# Altium schematic symbol library Analog Devices Operational Amplifiers.SchLib: 2102 symbols (part 28 of 35) (continued)
## ADA4895-2ARMZ
designator U?
Double Channel Low Wide Band Noise Operational Amplifier, 236 MHz BW, 943 V/us SR, Industrial, 10-pin SOP (RM-10), Tray; Generic Part Number: ADA4895-2; Manufacturer: Analog Devices; PartNumber: ADA4895-2ARMZ; Amplifiers Per Package: 2; Input Bias Current: 11uA; Input Offset Voltage: 28uV; Iq/Amp: 3mA; Small Signal Bandwidth: 236MHz; V Span Max: 10V; V Span Min: 3V; DatasheetVersion: Rev. 0; PackageReference: RM-10; PackageDescription: 10-Pin Mini Small Outline Package, Body 3 x 3 mm, Pitch 0.5 mm; Supplier 1: Digi-Key; Supplier Part Number 1: ADA4895-2ARMZ-ND; Supplier 2: Newark; Supplier Part Number 2: 45W7013; Packing: Tray; Slew Rate: 943V/us; Mounting Technology: Surface Mount; Code_JEDEC: MO-187-BA; ComponentLink1Description: Manufacturer URL; ComponentLink1URL: http://www.analog.com/en/index.html; ComponentLink2Description: Datasheet; ComponentLink2URL: http://www.analog.com/static/imported-files/data_sheets/ADA4895-2.PDF; ComponentLink3Description: Package Specification; ComponentLink3URL: http://www.analog.com/static/imported-files/packages/PKG_PDF/MSOP%28RM%29/RM_10.pdf
footprint ADI-RM-10_N (SOP, 10-Leads, Body 3x3mm, Pitch 0.5mm, IPC Medium Density)
footprint ADI-RM-10_L (SOP, 10-Leads, Body 3x3mm, Pitch 0.5mm, IPC High Density)
footprint ADI-RM-10_M (SOP, 10-Leads, Body 3x3mm, Pitch 0.5mm, IPC Low Density)
pins on every part: 4 -VS (power) "Negative Supply.", 10 +VS (power) "Positive Supply."
part A pins: 1 OUT 1 (out) "Output 1.", 2 -IN 1 (in) "Inverting Input 1.", 3 +IN 1 (in) "Noninverting Input 1.", 5 ~{DISABLE1} (in) "Disable 1."
part B pins: 6 ~{DISABLE2} (in) "Disable 2.", 7 +IN 2 (in) "Noninverting Input 2.", 8 -IN 2 (in) "Inverting Input 2.", 9 OUT 2 (out) "Output 2."

## ADA4895-2ARMZ-R7
designator U?
Double Channel Low Wide Band Noise Operational Amplifier, 236 MHz BW, 943 V/us SR, Industrial, 10-pin SOP (RM-10), Reel; Generic Part Number: ADA4895-2; Manufacturer: Analog Devices; PartNumber: ADA4895-2ARMZ-R7; Amplifiers Per Package: 2; Input Bias Current: 11uA; Input Offset Voltage: 28uV; Iq/Amp: 3mA; Small Signal Bandwidth: 236MHz; V Span Max: 10V; V Span Min: 3V; DatasheetVersion: Rev. 0; PackageReference: RM-10; PackageDescription: 10-Pin Mini Small Outline Package, Body 3 x 3 mm, Pitch 0.5 mm; Supplier 1: Digi-Key; Supplier Part Number 1: ADA4895-2ARMZ-R7TR-ND; Supplier 2: Digi-Key; Supplier Part Number 2: ADA4895-2ARMZ-R7CT-ND; Supplier 3: Digi-Key; Supplier Part Number 3: ADA4895-2ARMZ-R7DKR-ND; Supplier 4: Farnell; Supplier Part Number 4: 2250673; Supplier 5: Newark; Supplier Part Number 5: 45W7015; Supplier 6: Newark; Supplier Part Number 6: 47W3297; Packing: Reel; Slew Rate: 943V/us; Mounting Technology: Surface Mount; Code_JEDEC: MO-187-BA; ComponentLink1Description: Manufacturer URL; ComponentLink1URL: http://www.analog.com/en/index.html; ComponentLink2Description: Datasheet; ComponentLink2URL: http://www.analog.com/static/imported-files/data_sheets/ADA4895-2.PDF; ComponentLink3Description: Package Specification; ComponentLink3URL: http://www.analog.com/static/imported-files/packages/PKG_PDF/MSOP%28RM%29/RM_10.pdf
footprint ADI-RM-10_N (SOP, 10-Leads, Body 3x3mm, Pitch 0.5mm, IPC Medium Density)
footprint ADI-RM-10_L (SOP, 10-Leads, Body 3x3mm, Pitch 0.5mm, IPC High Density)
footprint ADI-RM-10_M (SOP, 10-Leads, Body 3x3mm, Pitch 0.5mm, IPC Low Density)
pins on every part: 4 -VS (power) "Negative Supply.", 10 +VS (power) "Positive Supply."
part A pins: 1 OUT 1 (out) "Output 1.", 2 -IN 1 (in) "Inverting Input 1.", 3 +IN 1 (in) "Noninverting Input 1.", 5 ~{DISABLE1} (in) "Disable 1."
part B pins: 6 ~{DISABLE2} (in) "Disable 2.", 7 +IN 2 (in) "Noninverting Input 2.", 8 -IN 2 (in) "Inverting Input 2.", 9 OUT 2 (out) "Output 2."

## ADA4895-2ARMZ-RL
designator U?
Double Channel Low Wide Band Noise Operational Amplifier, 236 MHz BW, 943 V/us SR, Industrial, 10-pin SOP (RM-10), Reel; Generic Part Number: ADA4895-2; Manufacturer: Analog Devices; PartNumber: ADA4895-2ARMZ-RL; Amplifiers Per Package: 2; Input Bias Current: 11uA; Input Offset Voltage: 28uV; Iq/Amp: 3mA; Small Signal Bandwidth: 236MHz; V Span Max: 10V; V Span Min: 3V; DatasheetVersion: Rev. 0; PackageReference: RM-10; PackageDescription: 10-Pin Mini Small Outline Package, Body 3 x 3 mm, Pitch 0.5 mm; Supplier 1: Digi-Key; Supplier Part Number 1: ADA4895-2ARMZ-RL-ND; Supplier 2: Newark; Supplier Part Number 2: 45W7014; Packing: Reel; Slew Rate: 943V/us; Mounting Technology: Surface Mount; Code_JEDEC: MO-187-BA; ComponentLink1Description: Manufacturer URL; ComponentLink1URL: http://www.analog.com/en/index.html; ComponentLink2Description: Datasheet; ComponentLink2URL: http://www.analog.com/static/imported-files/data_sheets/ADA4895-2.PDF; ComponentLink3Description: Package Specification; ComponentLink3URL: http://www.analog.com/static/imported-files/packages/PKG_PDF/MSOP%28RM%29/RM_10.pdf
footprint ADI-RM-10_N (SOP, 10-Leads, Body 3x3mm, Pitch 0.5mm, IPC Medium Density)
footprint ADI-RM-10_L (SOP, 10-Leads, Body 3x3mm, Pitch 0.5mm, IPC High Density)
footprint ADI-RM-10_M (SOP, 10-Leads, Body 3x3mm, Pitch 0.5mm, IPC Low Density)
pins on every part: 4 -VS (power) "Negative Supply.", 10 +VS (power) "Positive Supply."
part A pins: 1 OUT 1 (out) "Output 1.", 2 -IN 1 (in) "Inverting Input 1.", 3 +IN 1 (in) "Noninverting Input 1.", 5 ~{DISABLE1} (in) "Disable 1."
part B pins: 6 ~{DISABLE2} (in) "Disable 2.", 7 +IN 2 (in) "Noninverting Input 2.", 8 -IN 2 (in) "Inverting Input 2.", 9 OUT 2 (out) "Output 2."

## ADA4896-2ACPZ-R2
designator U?
Double Channel Low Wide Band Noise Operational Amplifier, 230 MHz BW, 120 V/us SR, Industrial, 8-pin SON (CP-8-11), Reel; Generic Part Number: ADA4896-2; Manufacturer: Analog Devices; PartNumber: ADA4896-2ACPZ-R2; Amplifiers Per Package: 2; Input Bias Current: 11uA; Input Offset Voltage: 28uV; Iq/Amp: 3mA; Small Signal Bandwidth: 230MHz; V Span Max: 10V; V Span Min: 3V; DatasheetVersion: Rev. B; PackageVersion: 01-24-2011-B; PackageReference: CP-8-11; PackageDescription: 8-Pin Lead Frame Chip Scale Package, Body 3 x 3 mm, Pitch 0.5 mm; Packing: Reel; Slew Rate: 120V/us; Mounting Technology: Surface Mount; Code_JEDEC: MO-229-WEED; ComponentLink1Description: Manufacturer URL; ComponentLink1URL: http://www.analog.com/en/index.html; ComponentLink2Description: Datasheet; ComponentLink2URL: http://www.analog.com/static/imported-files/data_sheets/ADA4896-2_4897-1_4897-2.PDF; ComponentLink3Description: Package Specification; ComponentLink3URL: http://www.analog.com/static/imported-files/packages/PKG_PDF/LFCSP(CP)/CP_8_11.pdf
footprint ADI-CP-8-11_N (SON, 8-Leads, Body 3x3mm, Pitch 0.5mm, Thermal Pad 2.34 x 1.60mm, IPC Medium Density)
footprint ADI-CP-8-11_L (SON, 8-Leads, Body 3x3mm, Pitch 0.5mm, Thermal Pad 2.34 x 1.60mm, IPC High Density)
footprint ADI-CP-8-11_M (SON, 8-Leads, Body 3x3mm, Pitch 0.5mm, Thermal Pad 2.34 x 1.60mm, IPC Low Density)
pins on every part: 4 -VS (power), 8 +VS (power), 9 EP
part A pins: 1 OUT 1 (out), 2 -IN 1 (in), 3 +IN 1 (in)
part B pins: 5 +IN 2 (in), 6 -IN 2 (in), 7 OUT 2 (out)

## ADA4896-2ACPZ-R7
designator U?
Double Channel Low Wide Band Noise Operational Amplifier, 230 MHz BW, 120 V/us SR, Industrial, 8-pin SON (CP-8-11), Reel; Generic Part Number: ADA4896-2; Manufacturer: Analog Devices; PartNumber: ADA4896-2ACPZ-R7; Amplifiers Per Package: 2; Input Bias Current: 11uA; Input Offset Voltage: 28uV; Iq/Amp: 3mA; Small Signal Bandwidth: 230MHz; V Span Max: 10V; V Span Min: 3V; DatasheetVersion: Rev. B; PackageVersion: 01-24-2011-B; PackageReference: CP-8-11; PackageDescription: 8-Pin Lead Frame Chip Scale Package, Body 3 x 3 mm, Pitch 0.5 mm; Supplier 1: Digi-Key; Supplier Part Number 1: ADA4896-2ACPZ-R7-ND; Supplier 2: Newark; Supplier Part Number 2: 58T8813; Packing: Reel; Slew Rate: 120V/us; Mounting Technology: Surface Mount; Code_JEDEC: MO-229-WEED; ComponentLink1Description: Manufacturer URL; ComponentLink1URL: http://www.analog.com/en/index.html; ComponentLink2Description: Datasheet; ComponentLink2URL: http://www.analog.com/static/imported-files/data_sheets/ADA4896-2_4897-1_4897-2.PDF; ComponentLink3Description: Package Specification; ComponentLink3URL: http://www.analog.com/static/imported-files/packages/PKG_PDF/LFCSP(CP)/CP_8_11.pdf
footprint ADI-CP-8-11_N (SON, 8-Leads, Body 3x3mm, Pitch 0.5mm, Thermal Pad 2.34 x 1.60mm, IPC Medium Density)
footprint ADI-CP-8-11_L (SON, 8-Leads, Body 3x3mm, Pitch 0.5mm, Thermal Pad 2.34 x 1.60mm, IPC High Density)
footprint ADI-CP-8-11_M (SON, 8-Leads, Body 3x3mm, Pitch 0.5mm, Thermal Pad 2.34 x 1.60mm, IPC Low Density)
pins on every part: 4 -VS (power), 8 +VS (power), 9 EP
part A pins: 1 OUT 1 (out), 2 -IN 1 (in), 3 +IN 1 (in)
part B pins: 5 +IN 2 (in), 6 -IN 2 (in), 7 OUT 2 (out)

## ADA4896-2ACPZ-RL
designator U?
Double Channel Low Wide Band Noise Operational Amplifier, 230 MHz BW, 120 V/us SR, Industrial, 8-pin SON (CP-8-11), Reel; Generic Part Number: ADA4896-2; Manufacturer: Analog Devices; PartNumber: ADA4896-2ACPZ-RL; Amplifiers Per Package: 2; Input Bias Current: 11uA; Input Offset Voltage: 28uV; Iq/Amp: 3mA; Small Signal Bandwidth: 230MHz; V Span Max: 10V; V Span Min: 3V; DatasheetVersion: Rev. B; PackageVersion: 01-24-2011-B; PackageReference: CP-8-11; PackageDescription: 8-Pin Lead Frame Chip Scale Package, Body 3 x 3 mm, Pitch 0.5 mm; Supplier 1: Digi-Key; Supplier Part Number 1: ADA4896-2ACPZ-RL-ND; Packing: Reel; Slew Rate: 120V/us; Mounting Technology: Surface Mount; Code_JEDEC: MO-229-WEED; ComponentLink1Description: Manufacturer URL; ComponentLink1URL: http://www.analog.com/en/index.html; ComponentLink2Description: Datasheet; ComponentLink2URL: http://www.analog.com/static/imported-files/data_sheets/ADA4896-2_4897-1_4897-2.PDF; ComponentLink3Description: Package Specification; ComponentLink3URL: http://www.analog.com/static/imported-files/packages/PKG_PDF/LFCSP(CP)/CP_8_11.pdf
footprint ADI-CP-8-11_N (SON, 8-Leads, Body 3x3mm, Pitch 0.5mm, Thermal Pad 2.34 x 1.60mm, IPC Medium Density)
footprint ADI-CP-8-11_L (SON, 8-Leads, Body 3x3mm, Pitch 0.5mm, Thermal Pad 2.34 x 1.60mm, IPC High Density)
footprint ADI-CP-8-11_M (SON, 8-Leads, Body 3x3mm, Pitch 0.5mm, Thermal Pad 2.34 x 1.60mm, IPC Low Density)
pins on every part: 4 -VS (power), 8 +VS (power), 9 EP
part A pins: 1 OUT 1 (out), 2 -IN 1 (in), 3 +IN 1 (in)
part B pins: 5 +IN 2 (in), 6 -IN 2 (in), 7 OUT 2 (out)

## ADA4896-2ARMZ
designator U?
Double Channel Low Wide Band Noise Operational Amplifier, 230 MHz BW, 120 V/us SR, Industrial, 8-pin SOP (RM-8), Tube; Generic Part Number: ADA4896-2; Manufacturer: Analog Devices; PartNumber: ADA4896-2ARMZ; Amplifiers Per Package: 2; Input Bias Current: 11uA; Input Offset Voltage: 28uV; Iq/Amp: 3mA; Small Signal Bandwidth: 230MHz; V Span Max: 10V; V Span Min: 3V; DatasheetVersion: Rev. B; PackageReference: RM-8; PackageDescription: 8-Pin Mini Small Outline Package, Body 3 x 3 mm, Pitch 0.65 mm; Supplier 1: Digi-Key; Supplier Part Number 1: ADA4896-2ARMZ-ND; Supplier 2: Farnell; Supplier Part Number 2: 2008778; Supplier 3: Newark; Supplier Part Number 3: 58T8814; Packing: Tube; Slew Rate: 120V/us; Mounting Technology: Surface Mount; Code_JEDEC: MO-187-AA; ComponentLink1Description: Manufacturer URL; ComponentLink1URL: http://www.analog.com/en/index.html; ComponentLink2Description: Datasheet; ComponentLink2URL: http://www.analog.com/static/imported-files/data_sheets/ADA4896-2_4897-1_4897-2.PDF; ComponentLink3Description: Package Specification; ComponentLink3URL: http://www.analog.com/static/imported-files/packages/PKG_PDF/MSOP%28RM%29/RM_8.pdf
footprint ADI-RM-8_N (SOP, 8-Leads, Body 3x3mm, Pitch 0.65mm, IPC Medium Density)
footprint ADI-RM-8_L (SOP, 8-Leads, Body 3x3mm, Pitch 0.65mm, IPC High Density)
footprint ADI-RM-8_M (SOP, 8-Leads, Body 3x3mm, Pitch 0.65mm, IPC Low Density)
pins on every part: 4 -VS (power), 8 +VS (power)
part A pins: 1 OUT 1 (out), 2 -IN 1 (in), 3 +IN 1 (in)
part B pins: 5 +IN 2 (in), 6 -IN 2 (in), 7 OUT 2 (out)

## ADA4896-2ARMZ-R7
designator U?
Double Channel Low Wide Band Noise Operational Amplifier, 230 MHz BW, 120 V/us SR, Industrial, 8-pin SOP (RM-8), Reel; Generic Part Number: ADA4896-2; Manufacturer: Analog Devices; PartNumber: ADA4896-2ARMZ-R7; Amplifiers Per Package: 2; Input Bias Current: 11uA; Input Offset Voltage: 28uV; Iq/Amp: 3mA; Small Signal Bandwidth: 230MHz; V Span Max: 10V; V Span Min: 3V; DatasheetVersion: Rev. B; PackageReference: RM-8; PackageDescription: 8-Pin Mini Small Outline Package, Body 3 x 3 mm, Pitch 0.65 mm; Supplier 1: Digi-Key; Supplier Part Number 1: ADA4896-2ARMZ-R7TR-ND; Supplier 2: Digi-Key; Supplier Part Number 2: ADA4896-2ARMZ-R7CT-ND; Supplier 3: Digi-Key; Supplier Part Number 3: ADA4896-2ARMZ-R7DKR-ND; Supplier 4: Newark; Supplier Part Number 4: 58T8815; Packing: Reel; Slew Rate: 120V/us; Mounting Technology: Surface Mount; Code_JEDEC: MO-187-AA; ComponentLink1Description: Manufacturer URL; ComponentLink1URL: http://www.analog.com/en/index.html; ComponentLink2Description: Datasheet; ComponentLink2URL: http://www.analog.com/static/imported-files/data_sheets/ADA4896-2_4897-1_4897-2.PDF; ComponentLink3Description: Package Specification; ComponentLink3URL: http://www.analog.com/static/imported-files/packages/PKG_PDF/MSOP%28RM%29/RM_8.pdf
footprint ADI-RM-8_N (SOP, 8-Leads, Body 3x3mm, Pitch 0.65mm, IPC Medium Density)
footprint ADI-RM-8_L (SOP, 8-Leads, Body 3x3mm, Pitch 0.65mm, IPC High Density)
footprint ADI-RM-8_M (SOP, 8-Leads, Body 3x3mm, Pitch 0.65mm, IPC Low Density)
pins on every part: 4 -VS (power), 8 +VS (power)
part A pins: 1 OUT 1 (out), 2 -IN 1 (in), 3 +IN 1 (in)
part B pins: 5 +IN 2 (in), 6 -IN 2 (in), 7 OUT 2 (out)

## ADA4896-2ARMZ-RL
designator U?
Double Channel Low Wide Band Noise Operational Amplifier, 230 MHz BW, 120 V/us SR, Industrial, 8-pin SOP (RM-8), Reel; Generic Part Number: ADA4896-2; Manufacturer: Analog Devices; PartNumber: ADA4896-2ARMZ-RL; Amplifiers Per Package: 2; Input Bias Current: 11uA; Input Offset Voltage: 28uV; Iq/Amp: 3mA; Small Signal Bandwidth: 230MHz; V Span Max: 10V; V Span Min: 3V; DatasheetVersion: Rev. B; PackageReference: RM-8; PackageDescription: 8-Pin Mini Small Outline Package, Body 3 x 3 mm, Pitch 0.65 mm; Packing: Reel; Slew Rate: 120V/us; Mounting Technology: Surface Mount; Code_JEDEC: MO-187-AA; ComponentLink1Description: Manufacturer URL; ComponentLink1URL: http://www.analog.com/en/index.html; ComponentLink2Description: Datasheet; ComponentLink2URL: http://www.analog.com/static/imported-files/data_sheets/ADA4896-2_4897-1_4897-2.PDF; ComponentLink3Description: Package Specification; ComponentLink3URL: http://www.analog.com/static/imported-files/packages/PKG_PDF/MSOP%28RM%29/RM_8.pdf
footprint ADI-RM-8_N (SOP, 8-Leads, Body 3x3mm, Pitch 0.65mm, IPC Medium Density)
footprint ADI-RM-8_L (SOP, 8-Leads, Body 3x3mm, Pitch 0.65mm, IPC High Density)
footprint ADI-RM-8_M (SOP, 8-Leads, Body 3x3mm, Pitch 0.65mm, IPC Low Density)
pins on every part: 4 -VS (power), 8 +VS (power)
part A pins: 1 OUT 1 (out), 2 -IN 1 (in), 3 +IN 1 (in)
part B pins: 5 +IN 2 (in), 6 -IN 2 (in), 7 OUT 2 (out)

## ADA4897-1ARJZ-R2
designator U?
Single Channel Low Wide Band Noise Operational Amplifier, 230 MHz BW, 120 V/us SR, Industrial, 6-pin SOT23 (RJ-6), Reel; Generic Part Number: ADA4897-1; Manufacturer: Analog Devices; PartNumber: ADA4897-1ARJZ-R2; Amplifiers Per Package: 1; Input Bias Current: 11uA; Input Offset Voltage: 28uV; Iq/Amp: 3mA; Small Signal Bandwidth: 230MHz; V Span Max: 10V; V Span Min: 3V; DatasheetVersion: Rev. B; PackageVersion: 121608-A; PackageReference: RJ-6; PackageDescription: 6-Pin Small Outline Transistor Package, Body 2.9 x 1.6 mm, Pitch 0.95 mm; Packing: Reel; Slew Rate: 120V/us; Mounting Technology: Surface Mount; Code_JEDEC: MO-178-AB; ComponentLink1Description: Manufacturer URL; ComponentLink1URL: http://www.analog.com/en/index.html; ComponentLink2Description: Datasheet; ComponentLink2URL: http://www.analog.com/static/imported-files/data_sheets/ADA4896-2_4897-1_4897-2.PDF; ComponentLink3Description: Package Specification; ComponentLink3URL: http://www.analog.com/static/imported-files/packages/PKG_PDF/SOT-23(RJ)/RJ_6.pdf; ComponentLink4Description: Reference Circuit; ComponentLink4URL: http://search.analog.com/search/ProductSearch.aspx?query=ada4897-1&amp;locale=en#product-recommendations
footprint ADI-RJ-6_N (SOT23, 6-Leads, Body 2.9x1.6mm, Pitch 0.95mm, IPC Medium Density)
footprint ADI-RJ-6_L (SOT23, 6-Leads, Body 2.9x1.6mm, Pitch 0.95mm, IPC High Density)
footprint ADI-RJ-6_M (SOT23, 6-Leads, Body 2.9x1.6mm, Pitch 0.95mm, IPC Low Density)
pins: 1 OUT (hiz) "Output.", 2 -VS (power) "Negative Supply.", 3 +IN (in) "Noninverting Input.", 4 -IN (in) "Inverting Input.", 5 ~{DISABLE} (in) "Disable.", 6 +VS (power) "Positive Supply."

## ADA4897-1ARJZ-R7
designator U?
Single Channel Low Wide Band Noise Operational Amplifier, 230 MHz BW, 120 V/us SR, Industrial, 6-pin SOT23 (RJ-6), Reel; Generic Part Number: ADA4897-1; Manufacturer: Analog Devices; PartNumber: ADA4897-1ARJZ-R7; Amplifiers Per Package: 1; Input Bias Current: 11uA; Input Offset Voltage: 28uV; Iq/Amp: 3mA; Small Signal Bandwidth: 230MHz; V Span Max: 10V; V Span Min: 3V; DatasheetVersion: Rev. B; PackageVersion: 121608-A; PackageReference: RJ-6; PackageDescription: 6-Pin Small Outline Transistor Package, Body 2.9 x 1.6 mm, Pitch 0.95 mm; Supplier 1: Digi-Key; Supplier Part Number 1: ADA4897-1ARJZ-R7TR-ND; Supplier 2: Digi-Key; Supplier Part Number 2: ADA4897-1ARJZ-R7CT-ND; Supplier 3: Digi-Key; Supplier Part Number 3: ADA4897-1ARJZ-R7DKR-ND; Supplier 4: Newark; Supplier Part Number 4: 58T8817; Packing: Reel; Slew Rate: 120V/us; Mounting Technology: Surface Mount; Code_JEDEC: MO-178-AB; ComponentLink1Description: Manufacturer URL; ComponentLink1URL: http://www.analog.com/en/index.html; ComponentLink2Description: Datasheet; ComponentLink2URL: http://www.analog.com/static/imported-files/data_sheets/ADA4896-2_4897-1_4897-2.PDF; ComponentLink3Description: Package Specification; ComponentLink3URL: http://www.analog.com/static/imported-files/packages/PKG_PDF/SOT-23(RJ)/RJ_6.pdf; ComponentLink4Description: Reference Circuit; ComponentLink4URL: http://search.analog.com/search/ProductSearch.aspx?query=ada4897-1&amp;locale=en#product-recommendations
footprint ADI-RJ-6_N (SOT23, 6-Leads, Body 2.9x1.6mm, Pitch 0.95mm, IPC Medium Density)
footprint ADI-RJ-6_L (SOT23, 6-Leads, Body 2.9x1.6mm, Pitch 0.95mm, IPC High Density)
footprint ADI-RJ-6_M (SOT23, 6-Leads, Body 2.9x1.6mm, Pitch 0.95mm, IPC Low Density)
pins: 1 OUT (hiz) "Output.", 2 -VS (power) "Negative Supply.", 3 +IN (in) "Noninverting Input.", 4 -IN (in) "Inverting Input.", 5 ~{DISABLE} (in) "Disable.", 6 +VS (power) "Positive Supply."

## ADA4897-1ARJZ-RL
designator U?
Single Channel Low Wide Band Noise Operational Amplifier, 230 MHz BW, 120 V/us SR, Industrial, 6-pin SOT23 (RJ-6), Reel; Generic Part Number: ADA4897-1; Manufacturer: Analog Devices; PartNumber: ADA4897-1ARJZ-RL; Amplifiers Per Package: 1; Input Bias Current: 11uA; Input Offset Voltage: 28uV; Iq/Amp: 3mA; Small Signal Bandwidth: 230MHz; V Span Max: 10V; V Span Min: 3V; DatasheetVersion: Rev. B; PackageVersion: 121608-A; PackageReference: RJ-6; PackageDescription: 6-Pin Small Outline Transistor Package, Body 2.9 x 1.6 mm, Pitch 0.95 mm; Supplier 1: Digi-Key; Supplier Part Number 1: ADA4897-1ARJZ-RL-ND; Supplier 2: Newark; Supplier Part Number 2: 58T8816; Packing: Reel; Slew Rate: 120V/us; Mounting Technology: Surface Mount; Code_JEDEC: MO-178-AB; ComponentLink1Description: Manufacturer URL; ComponentLink1URL: http://www.analog.com/en/index.html; ComponentLink2Description: Datasheet; ComponentLink2URL: http://www.analog.com/static/imported-files/data_sheets/ADA4896-2_4897-1_4897-2.PDF; ComponentLink3Description: Package Specification; ComponentLink3URL: http://www.analog.com/static/imported-files/packages/PKG_PDF/SOT-23(RJ)/RJ_6.pdf; ComponentLink4Description: Reference Circuit; ComponentLink4URL: http://search.analog.com/search/ProductSearch.aspx?query=ada4897-1&amp;locale=en#product-recommendations
footprint ADI-RJ-6_N (SOT23, 6-Leads, Body 2.9x1.6mm, Pitch 0.95mm, IPC Medium Density)
footprint ADI-RJ-6_L (SOT23, 6-Leads, Body 2.9x1.6mm, Pitch 0.95mm, IPC High Density)
footprint ADI-RJ-6_M (SOT23, 6-Leads, Body 2.9x1.6mm, Pitch 0.95mm, IPC Low Density)
pins: 1 OUT (hiz) "Output.", 2 -VS (power) "Negative Supply.", 3 +IN (in) "Noninverting Input.", 4 -IN (in) "Inverting Input.", 5 ~{DISABLE} (in) "Disable.", 6 +VS (power) "Positive Supply."

## ADA4897-1ARZ
designator U?
Single Channel Low Wide Band Noise Operational Amplifier, 230 MHz BW, 120 V/us SR, Industrial, 8-pin SOIC (R-8), Tube; Generic Part Number: ADA4897-1; Manufacturer: Analog Devices; PartNumber: ADA4897-1ARZ; Amplifiers Per Package: 1; Input Bias Current: 11uA; Input Offset Voltage: 28uV; Iq/Amp: 3mA; Small Signal Bandwidth: 230MHz; V Span Max: 10V; V Span Min: 3V; DatasheetVersion: Rev. B; PackageVersion: 060506-A; PackageReference: R-8; PackageDescription: 8-Pin Standard Small Outline Package, Body 3.9 x 4.9 mm, Pitch 1.27 mm; Supplier 1: Digi-Key; Supplier Part Number 1: ADA4897-1ARZ-ND; Supplier 2: Farnell; Supplier Part Number 2: 2008779; Supplier 3: Newark; Supplier Part Number 3: 58T8818; Packing: Tube; Slew Rate: 120V/us; Mounting Technology: Surface Mount; Code_JEDEC: MS-012-AA; ComponentLink1Description: Manufacturer URL; ComponentLink1URL: http://www.analog.com/en/index.html; ComponentLink2Description: Datasheet; ComponentLink2URL: http://www.analog.com/static/imported-files/data_sheets/ADA4896-2_4897-1_4897-2.PDF; ComponentLink3Description: Package Specification; ComponentLink3URL: http://www.analog.com/static/imported-files/packages/PKG_PDF/SOIC_Narrow%20(R)/R_8.pdf; ComponentLink4Description: Reference Circuit; ComponentLink4URL: http://search.analog.com/search/ProductSearch.aspx?query=ada4897-1&amp;locale=en#product-recommendations
footprint ADI-R-8_N (SOIC, 8-Leads, Body 4.9x3.9mm, Pitch 1.27mm, IPC Medium Density)
footprint ADI-R-8_L (SOIC, 8-Leads, Body 4.9x3.9mm, Pitch 1.27mm, IPC High Density)
footprint ADI-R-8_M (SOIC, 8-Leads, Body 4.9x3.9mm, Pitch 1.27mm, IPC Low Density)
pins: 1 NC, 2 -IN (in), 3 +IN (in), 4 -VS (power), 5 NC, 6 OUT (hiz), 7 +VS (power), 8 ~{DISABLE} (in)

## ADA4897-1ARZ-R7
designator U?
Single Channel Low Wide Band Noise Operational Amplifier, 230 MHz BW, 120 V/us SR, Industrial, 8-pin SOIC (R-8), Reel; Generic Part Number: ADA4897-1; Manufacturer: Analog Devices; PartNumber: ADA4897-1ARZ-R7; Amplifiers Per Package: 1; Input Bias Current: 11uA; Input Offset Voltage: 28uV; Iq/Amp: 3mA; Small Signal Bandwidth: 230MHz; V Span Max: 10V; V Span Min: 3V; DatasheetVersion: Rev. B; PackageVersion: 060506-A; PackageReference: R-8; PackageDescription: 8-Pin Standard Small Outline Package, Body 3.9 x 4.9 mm, Pitch 1.27 mm; Supplier 1: Digi-Key; Supplier Part Number 1: ADA4897-1ARZ-R7TR-ND; Supplier 2: Digi-Key; Supplier Part Number 2: ADA4897-1ARZ-R7CT-ND; Supplier 3: Digi-Key; Supplier Part Number 3: ADA4897-1ARZ-R7DKR-ND; Packing: Reel; Slew Rate: 120V/us; Mounting Technology: Surface Mount; Code_JEDEC: MS-012-AA; ComponentLink1Description: Manufacturer URL; ComponentLink1URL: http://www.analog.com/en/index.html; ComponentLink2Description: Datasheet; ComponentLink2URL: http://www.analog.com/static/imported-files/data_sheets/ADA4896-2_4897-1_4897-2.PDF; ComponentLink3Description: Package Specification; ComponentLink3URL: http://www.analog.com/static/imported-files/packages/PKG_PDF/SOIC_Narrow%20(R)/R_8.pdf; ComponentLink4Description: Reference Circuit; ComponentLink4URL: http://search.analog.com/search/ProductSearch.aspx?query=ada4897-1&amp;locale=en#product-recommendations
footprint ADI-R-8_N (SOIC, 8-Leads, Body 4.9x3.9mm, Pitch 1.27mm, IPC Medium Density)
footprint ADI-R-8_L (SOIC, 8-Leads, Body 4.9x3.9mm, Pitch 1.27mm, IPC High Density)
footprint ADI-R-8_M (SOIC, 8-Leads, Body 4.9x3.9mm, Pitch 1.27mm, IPC Low Density)
pins: 1 NC, 2 -IN (in), 3 +IN (in), 4 -VS (power), 5 NC, 6 OUT (hiz), 7 +VS (power), 8 ~{DISABLE} (in)

## ADA4897-1ARZ-RL
designator U?
Single Channel Low Wide Band Noise Operational Amplifier, 230 MHz BW, 120 V/us SR, Industrial, 8-pin SOIC (R-8), Reel; Generic Part Number: ADA4897-1; Manufacturer: Analog Devices; PartNumber: ADA4897-1ARZ-RL; Amplifiers Per Package: 1; Input Bias Current: 11uA; Input Offset Voltage: 28uV; Iq/Amp: 3mA; Small Signal Bandwidth: 230MHz; V Span Max: 10V; V Span Min: 3V; DatasheetVersion: Rev. B; PackageVersion: 060506-A; PackageReference: R-8; PackageDescription: 8-Pin Standard Small Outline Package, Body 3.9 x 4.9 mm, Pitch 1.27 mm; Supplier 1: Digi-Key; Supplier Part Number 1: ADA4897-1ARZ-RL-ND; Packing: Reel; Slew Rate: 120V/us; Mounting Technology: Surface Mount; Code_JEDEC: MS-012-AA; ComponentLink1Description: Manufacturer URL; ComponentLink1URL: http://www.analog.com/en/index.html; ComponentLink2Description: Datasheet; ComponentLink2URL: http://www.analog.com/static/imported-files/data_sheets/ADA4896-2_4897-1_4897-2.PDF; ComponentLink3Description: Package Specification; ComponentLink3URL: http://www.analog.com/static/imported-files/packages/PKG_PDF/SOIC_Narrow%20(R)/R_8.pdf; ComponentLink4Description: Reference Circuit; ComponentLink4URL: http://search.analog.com/search/ProductSearch.aspx?query=ada4897-1&amp;locale=en#product-recommendations
footprint ADI-R-8_N (SOIC, 8-Leads, Body 4.9x3.9mm, Pitch 1.27mm, IPC Medium Density)
footprint ADI-R-8_L (SOIC, 8-Leads, Body 4.9x3.9mm, Pitch 1.27mm, IPC High Density)
footprint ADI-R-8_M (SOIC, 8-Leads, Body 4.9x3.9mm, Pitch 1.27mm, IPC Low Density)
pins: 1 NC, 2 -IN (in), 3 +IN (in), 4 -VS (power), 5 NC, 6 OUT (hiz), 7 +VS (power), 8 ~{DISABLE} (in)

## ADA4897-1SRJZ-EPR7
designator U?
Single Channel Low Wide Band Noise Operational Amplifier, 230 MHz BW, 120 V/us SR, Industrial, 6-pin SOT23 (RJ-6), Reel; Generic Part Number: ADA4897-1; Manufacturer: Analog Devices; PartNumber: ADA4897-1SRJZ-EPR7; Amplifiers Per Package: 1; Input Bias Current: 11uA; Input Offset Voltage: 28uV; Iq/Amp: 3mA; Small Signal Bandwidth: 230MHz; V Span Max: 10V; V Span Min: 3V; DatasheetVersion: Rev. B; PackageVersion: 121608-A; PackageReference: RJ-6; PackageDescription: 6-Pin Small Outline Transistor Package, Body 2.9 x 1.6 mm, Pitch 0.95 mm; Packing: Reel; Slew Rate: 120V/us; Mounting Technology: Surface Mount; Code_JEDEC: MO-178-AB; ComponentLink1Description: Manufacturer URL; ComponentLink1URL: http://www.analog.com/en/index.html; ComponentLink2Description: Datasheet; ComponentLink2URL: http://www.analog.com/static/imported-files/data_sheets/ADA4896-2_4897-1_4897-2.PDF; ComponentLink3Description: Package Specification; ComponentLink3URL: http://www.analog.com/static/imported-files/packages/PKG_PDF/SOT-23(RJ)/RJ_6.pdf; ComponentLink4Description: Reference Circuit; ComponentLink4URL: http://search.analog.com/search/ProductSearch.aspx?query=ada4897-1&amp;locale=en#product-recommendations
footprint ADI-RJ-6_N (SOT23, 6-Leads, Body 2.9x1.6mm, Pitch 0.95mm, IPC Medium Density)
footprint ADI-RJ-6_L (SOT23, 6-Leads, Body 2.9x1.6mm, Pitch 0.95mm, IPC High Density)
footprint ADI-RJ-6_M (SOT23, 6-Leads, Body 2.9x1.6mm, Pitch 0.95mm, IPC Low Density)
pins: 1 OUT (hiz) "Output.", 2 -VS (power) "Negative Supply.", 3 +IN (in) "Noninverting Input.", 4 -IN (in) "Inverting Input.", 5 ~{DISABLE} (in) "Disable.", 6 +VS (power) "Positive Supply."

## ADA4897-2ARMZ
designator U?
Double Channel Rail-to-Rail Operational Amplifier, 230 MHz BW, 120 V/us SR, Industrial, 10-pin SOP (RM-10), Tube; Generic Part Number: ADA4897-2; Manufacturer: Analog Devices; PartNumber: ADA4897-2ARMZ; Amplifiers Per Package: 2; Input Bias Current: 11uA; Input Offset Voltage: 28uV; Iq/Amp: 3mA; Small Signal Bandwidth: 230MHz; V Span Max: 10V; V Span Min: 3V; DatasheetVersion: Rev. B; PackageReference: RM-10; PackageDescription: 10-Pin Mini Small Outline Package, Body 3 x 3 mm, Pitch 0.5 mm; Supplier 1: Digi-Key; Supplier Part Number 1: ADA4897-2ARMZ-ND; Supplier 2: Farnell; Supplier Part Number 2: 2070701; Supplier 3: Newark; Supplier Part Number 3: 72T3482; Slew Rate: 120V/us; Mounting Technology: Surface Mount; Code_JEDEC: MO-187-BA; ComponentLink1Description: Manufacturer URL; ComponentLink1URL: http://www.analog.com/en/index.html; ComponentLink2Description: Datasheet; ComponentLink2URL: http://www.analog.com/static/imported-files/data_sheets/ADA4896-2_4897-1_4897-2.PDF; ComponentLink3Description: Package Specification; ComponentLink3URL: http://www.analog.com/static/imported-files/packages/PKG_PDF/MSOP%28RM%29/RM_10.pdf; ComponentLink4Description: Reference Circuit; ComponentLink4URL: http://search.analog.com/search/ProductSearch.aspx?query=ada4897-2&amp;locale=en#product-recommendations
footprint ADI-RM-10_N (SOP, 10-Leads, Body 3x3mm, Pitch 0.5mm, IPC Medium Density)
footprint ADI-RM-10_L (SOP, 10-Leads, Body 3x3mm, Pitch 0.5mm, IPC High Density)
footprint ADI-RM-10_M (SOP, 10-Leads, Body 3x3mm, Pitch 0.5mm, IPC Low Density)
pins on every part: 4 -VS (power) "Negative Supply.", 10 +VS (power) "Positive Supply."
part A pins: 1 OUT 1 (hiz) "Output 1.", 2 -IN 1 (in) "Inverting Input 1.", 3 +IN 1 (in) "Noninverting Input 1.", 5 ~{DISABLE1} (in) "Disable 1."
part B pins: 6 ~{DISABLE2} (in) "Disable 2.", 7 +IN 2 (in) "Noninverting Input 2.", 8 -IN 2 (in) "Inverting Input 2.", 9 OUT 2 (hiz) "Output 2."
